# Altium footprint library DSP_FPGA_Lib.PcbLib: 30 footprints (part 2 of 2)
Each footprint in its own frame and in the unit in brackets; x right, y up, seen from the top. Pads: shape width x height; smd on the part's side, far side on the other; paste and mask are expansions set on the pad; w line width, h text height; cw(c..) or ccw(c..) is an arc to the next point about the centre after c.
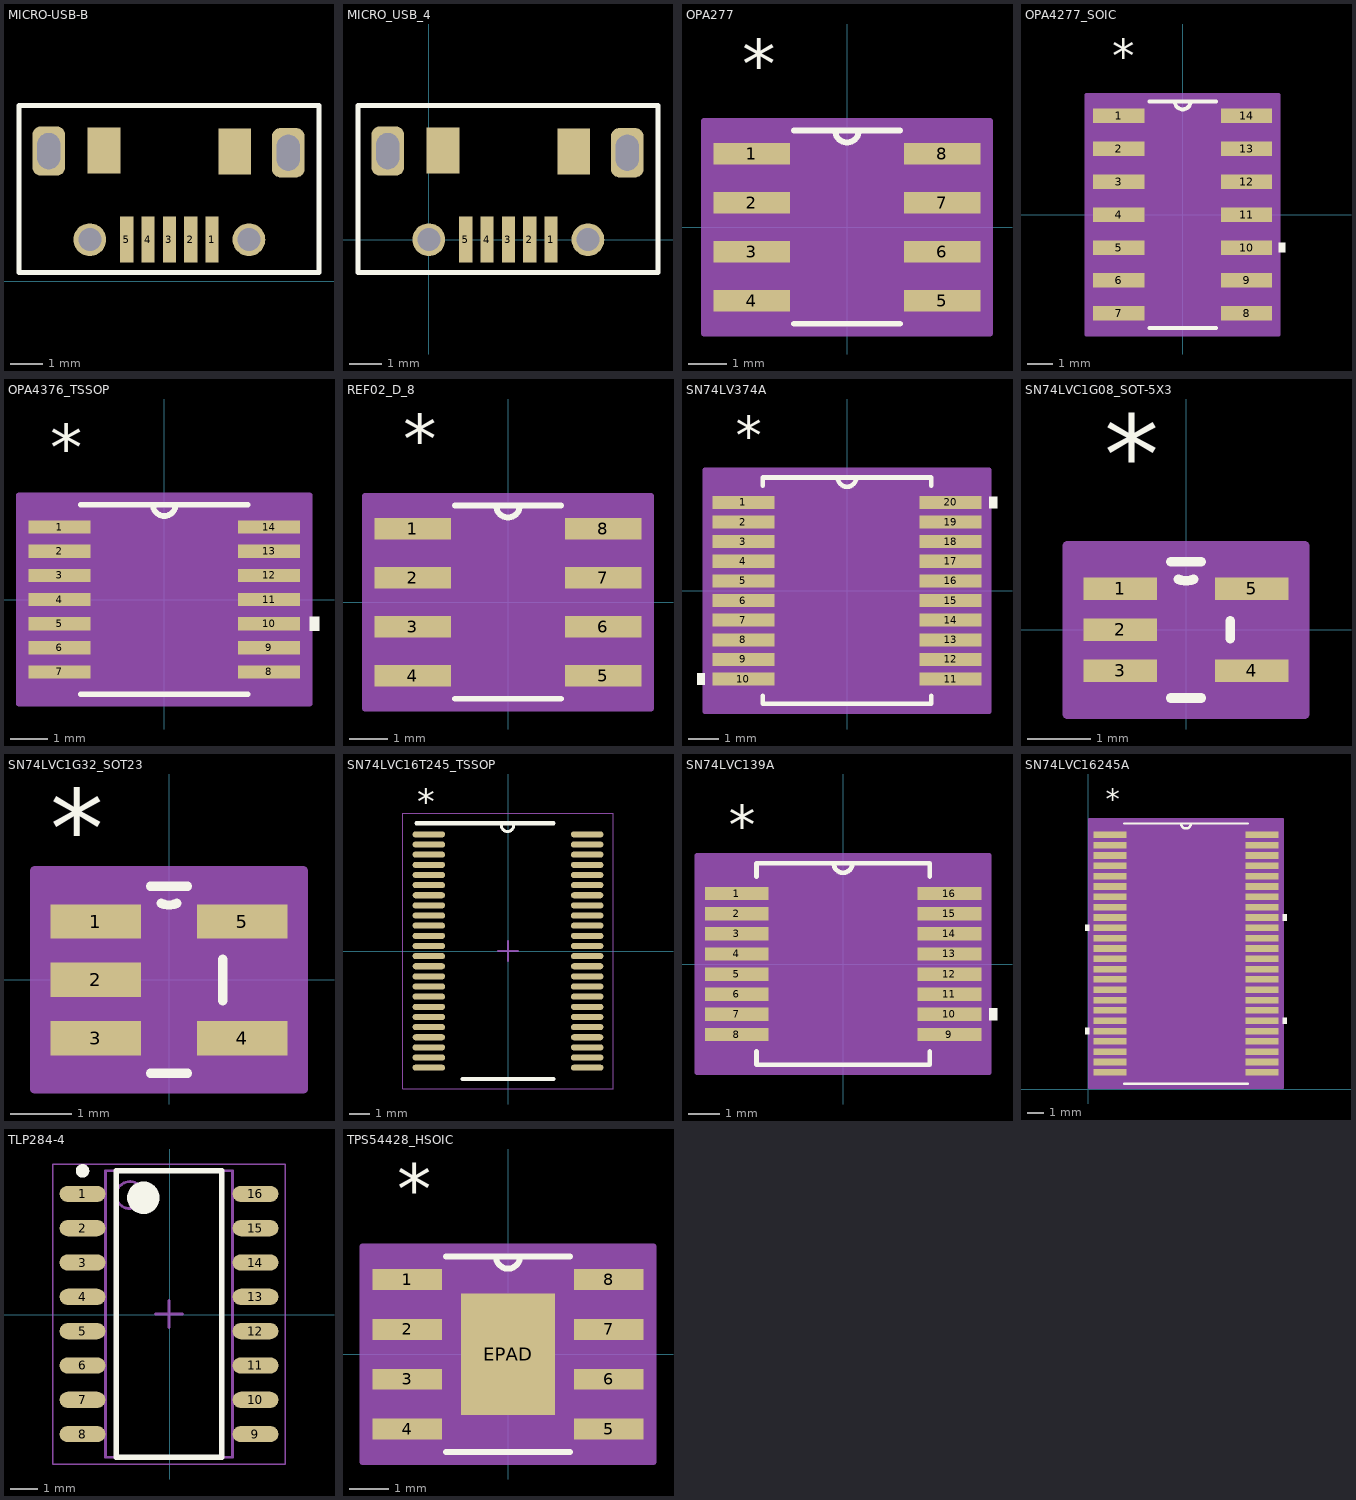
[diagram p1: the footprints below, top view; thin cyan lines are the x and y axes]

## MICRO-USB-B [mm] "MICRO-USB-B"
pads (11):
  rect 0.4x1.4 smd: 1(6.519,1.27) 2(5.869,1.27) 3(5.219,1.27) 4(4.569,1.27) 5(3.919,1.27)
  rrect50% 1x1.5 hole 0.7 slot 1.1 at 90 deg: ""(1.543,3.971) ""(8.844,3.92)
  round 1 hole 0.7: ""(2.794,1.27) ""(7.644,1.27)
  rect 1x1.4 smd: ""(3.226,3.988) ""(7.214,3.962)
Top Overlay:
  lines w0.152: 0.635,0.27 0.635,5.359 9.779,5.359 9.779,0.27 0.635,0.27
3D body "User Library-MicroUSB-B_Molex_105017-0001.SLDPRT": height 2.73, standoff -0.58, extent 1.107,1.123 9.307,6.553

## MICRO_USB_4 [mm]
pads (11):
  rect 0.4x1.4 smd: 1(3.725,0) 2(3.075,0) 3(2.425,0) 4(1.775,0) 5(1.125,0)
  rrect50% 1x1.5 hole 0.7 slot 1.1 at 90 deg: ""(-1.251,2.701) ""(6.05,2.65)
  round 1 hole 0.7: ""(0,0) ""(4.85,0)
  rect 1x1.4 smd: ""(0.432,2.718) ""(4.42,2.692)
Top Overlay:
  lines w0.152: -2.159,-1 6.985,-1 6.985,4.089 -2.159,4.089 -2.159,-1
3D body "User Library-MicroUSB-B_Molex_105017-0001.SLDPRT": height 2.73, standoff -0.58, extent -1.687,-0.147 6.513,5.283

## OPA277 [mil]
pads (8):
  rect 78x22 smd: 1(-97,75) 2(-97,25) 3(-97,-25) 4(-97,-75) 5(97,-75) 6(97,-25) 7(97,25) 8(97,75)
Top Overlay:
  lines w6: -54.08,-98.5 54.08,-98.5 ; -54.08,98.5 54.08,98.5 ; -12,98.5 ccw(c0,98.5) 12,98.5
  text "*" at -107,142 h50
Mechanical 13:
  lines w0: -12,98.5 ccw(c0,98.5) 12,98.5
  text "*" at -107,142 h50
Mechanical 15:
  region: 146,-108.5 -146,-108.5 -146,108.5 146,108.5
  lines w6: -146,-108.5 146,-108.5 146,108.5 -146,108.5 -146,-108.5
3D body "D8.stp": height 69.1, standoff 0, extent -122,-98.5 122,98.5

## OPA4277_SOIC [mil]
pads (14):
  rect 78x22 smd: 1(-97,150) 2(-97,100) 3(-97,50) 4(-97,0) 5(-97,-50) 6(-97,-100) 7(-97,-150) 8(97,-150) 9(97,-100) 10(97,-50) 11(97,0) 12(97,50) 13(97,100) 14(97,150)
Top Overlay:
  region: 146,-42.5 156,-42.5 156,-57.5 146,-57.5
  lines w6: -50.89,-172 50.89,-172 ; -50.89,172 50.89,172 ; -12,172 ccw(c0,172) 12,172
  text "*" at -107,217 h50
Mechanical 13:
  lines w0: -12,172 ccw(c0,172) 12,172
  text "*" at -107,217 h50
Mechanical 15:
  region: 146,-182 -146,-182 -146,182 146,182
  lines w6: -146,-182 146,-182 146,182 -146,182 -146,-182
3D body "D14.stp": height 69.1, standoff 0, extent -122,-172 122,172

## OPA4376_TSSOP [mil]
pads (14):
  rect 66x14 smd: 1(-111,76.77) 2(-111,51.18) 3(-111,25.59) 4(-111,0) 5(-111,-25.59) 6(-111,-51.18) 7(-111,-76.77) 8(111,-76.77) 9(111,-51.18) 10(111,-25.59) 11(111,0) 12(111,25.59) 13(111,51.18) 14(111,76.77)
Top Overlay:
  region: 154,-18.09 164,-18.09 164,-33.09 154,-33.09
  lines w6: -88.5,-100.5 88.5,-100.5 ; -88.5,100.5 88.5,100.5 ; -12,100.5 ccw(c0,100.5) 12,100.5
  text "*" at -121,135.77 h50
Mechanical 13:
  lines w0: -12,100.5 ccw(c0,100.5) 12,100.5
  text "*" at -121,135.77 h50
Mechanical 15:
  region: 154,-110.5 -154,-110.5 -154,110.5 154,110.5
  lines w6: -154,-110.5 154,-110.5 154,110.5 -154,110.5 -154,-110.5
3D body "PW14.stp": height 47.1, standoff 0, extent -130,-100.5 130,100.5

## REF02_D_8 [mil]
pads (8):
  rect 78x22 smd: 1(-97,75) 2(-97,25) 3(-97,-25) 4(-97,-75) 5(97,-75) 6(97,-25) 7(97,25) 8(97,75)
Top Overlay:
  lines w6: -54.08,-98.5 54.08,-98.5 ; -54.08,98.5 54.08,98.5 ; -12,98.5 ccw(c0,98.5) 12,98.5
  text "*" at -107,142 h50
Mechanical 13:
  lines w0: -12,98.5 ccw(c0,98.5) 12,98.5
  text "*" at -107,142 h50
Mechanical 15:
  region: 146,-108.5 -146,-108.5 -146,108.5 146,108.5
  lines w6: -146,-108.5 -146,108.5 146,108.5 146,-108.5 -146,-108.5
3D body "D8.stp": height 69.1, standoff 0, extent -122,-98.5 122,98.5

## SN74LV374A [mil]
pads (20):
  rect 81x17 smd: 1(-135,115.16) 2(-135,89.57) 3(-135,63.98) 4(-135,38.39) 5(-135,12.8) 6(-135,-12.8) 7(-135,-38.39) 8(-135,-63.98) 9(-135,-89.57) 10(-135,-115.16) 11(135,-115.16) 12(135,-89.57) 13(135,-63.98) 14(135,-38.39) 15(135,-12.8) 16(135,12.8) 17(135,38.39) 18(135,63.98) 19(135,89.57) 20(135,115.16)
Top Overlay:
  region: -185.5,-107.66 -195.5,-107.66 -195.5,-122.66 -185.5,-122.66
  region: 185.5,122.66 195.5,122.66 195.5,107.66 185.5,107.66
  lines w6: -110,-136.76 -110,-147.5 110,-147.5 110,-136.76 ; -110,136.76 -110,147.5 110,147.5 110,136.76 ; -12,147.5 ccw(c0,147.5) 12,147.5
  text "*" at -145,177.16 h50
Mechanical 13:
  lines w0: -12,147.5 ccw(c0,147.5) 12,147.5
  text "*" at -145,177.16 h50
Mechanical 15:
  region: 185.5,-157.5 -185.5,-157.5 -185.5,157.5 185.5,157.5
  lines w6: -185.5,-157.5 -185.5,157.5 185.5,157.5 185.5,-157.5 -185.5,-157.5
3D body "DB20.stp": height 79.1, standoff 0, extent -161.5,-147.5 161.5,147.5

## SN74LVC1G08_SOT-5X3 [mil]
pads (5):
  rect 46x14 smd: 1(-41,25.59) 2(-41,0) 3(-41,-25.59) 4(41,-25.59) 5(41,25.59)
Top Overlay:
  lines w6: -9.43,-42.5 9.43,-42.5 ; -9.43,42.5 9.43,42.5 ; -4.9,31.55 ccw(c0,42.5) 4.9,31.55 ; 27.5,-5.49 27.5,5.49
  text "*" at -51,84.59 h50
Mechanical 13:
  lines w0: -12,42.5 ccw(c0,42.5) 12,42.5
  text "*" at -51,84.59 h50
Mechanical 15:
  region: 74,-52.5 -74,-52.5 -74,52.5 74,52.5
  lines w6: -74,-52.5 -74,52.5 74,52.5 74,-52.5 -74,-52.5
3D body "DCK5.stp": height 43.1, standoff 0, extent -47,-42.5 47,42.5

## SN74LVC1G32_SOT23 [mil]
pads (5):
  rect 58x22 smd: 1(-47,37.4) 2(-47,0) 3(-47,-37.4) 4(47,-37.4) 5(47,37.4)
Top Overlay:
  lines w6: -11.91,-60 11.91,-60 ; -11.91,60 11.91,60 ; -4.92,49.05 ccw(c0,60) 4.92,49.05 ; 34.5,-13.3 34.5,13.3
  text "*" at -76,72.4 h50
Mechanical 13:
  lines w0: -12,60 ccw(c0,60) 12,60
  text "*" at -76,72.4 h50
Mechanical 15:
  region: 86,-70 -86,-70 -86,70 86,70
  lines w6: -86,-70 -86,70 86,70 86,-70 -86,-70
3D body "DBV5.stp": height 57.1, standoff 0, extent -59,-60 59,60

## SN74LVC16T245_TSSOP [mm]
pads (48):
  oval 1.6x0.3 smd paste+0 mask+0.051: 1(-3.9,5.75) 2(-3.9,5.25) 3(-3.9,4.75) 4(-3.9,4.25) 5(-3.9,3.75) 6(-3.9,3.25) 7(-3.9,2.75) 8(-3.9,2.25) 9(-3.9,1.75) 10(-3.9,1.25) 11(-3.9,0.75) 12(-3.9,0.25) 13(-3.9,-0.25) 14(-3.9,-0.75) 15(-3.9,-1.25) 16(-3.9,-1.75) 17(-3.9,-2.25) 18(-3.9,-2.75) 19(-3.9,-3.25) 20(-3.9,-3.75) 21(-3.9,-4.25) 22(-3.9,-4.75) 23(-3.9,-5.25) 24(-3.9,-5.75) 25(3.9,-5.75) 26(3.9,-5.25) 27(3.9,-4.75) 28(3.9,-4.25) 29(3.9,-3.75) 30(3.9,-3.25) 31(3.9,-2.75) 32(3.9,-2.25) 33(3.9,-1.75) 34(3.9,-1.25) 35(3.9,-0.75) 36(3.9,-0.25) 37(3.9,0.25) 38(3.9,0.75) 39(3.9,1.25) 40(3.9,1.75) 41(3.9,2.25) 42(3.9,2.75) 43(3.9,3.25) 44(3.9,3.75) 45(3.9,4.25) 46(3.9,4.75) 47(3.9,5.25) 48(3.9,5.75)
Top Overlay:
  lines w0.152: -0.33,6.198 ccw(c-0.025,6.198) 0.279,6.198
  lines w0.2: -4.5,6.3 2.25,6.3 ; -2.25,-6.3 2.25,-6.3
  text "*" at -4.464,6.718 h1.27
Mechanical 13:
  lines w0: -0.33,6.198 ccw(c-0.025,6.198) 0.279,6.198
  text "*" at -4.464,6.718 h1.27
Mechanical 15:
  lines w0.05: -5.2,-6.8 5.2,-6.8 5.2,6.8 -5.2,6.8 -5.2,-6.8
  lines w0.1: -0.5,0 0.5,0 ; 0,-0.5 0,0.5
3D body "DGG0048A.stp": height 1.1, standoff 0, extent -4.086,-6.252 4.035,6.248

## SN74LVC139A [mil]
pads (16):
  rect 81x17 smd: 1(-135,89.57) 2(-135,63.98) 3(-135,38.39) 4(-135,12.8) 5(-135,-12.8) 6(-135,-38.39) 7(-135,-63.98) 8(-135,-89.57) 9(135,-89.57) 10(135,-63.98) 11(135,-38.39) 12(135,-12.8) 13(135,12.8) 14(135,38.39) 15(135,63.98) 16(135,89.57)
Top Overlay:
  region: 185.5,-56.48 195.5,-56.48 195.5,-71.48 185.5,-71.48
  lines w6: -110,-111.17 -110,-128 110,-128 110,-111.17 ; -110,111.17 -110,128 110,128 110,111.17 ; -12,128 ccw(c0,128) 12,128
  text "*" at -145,151.57 h50
Mechanical 13:
  lines w0: -12,128 ccw(c0,128) 12,128
  text "*" at -145,151.57 h50
Mechanical 15:
  region: 185.5,-138 -185.5,-138 -185.5,138 185.5,138
  lines w6: -185.5,-138 185.5,-138 185.5,138 -185.5,138 -185.5,-138
3D body "DB16.stp": height 79.1, standoff 0, extent -161.5,-128 161.5,128

## SN74LVC16245A [mil]
pads (48):
  rect 80.5x16 smd: 1(53.25,615.5) 2(53.25,590.5) 3(53.25,565.5) 4(53.25,540.5) 5(53.25,515.5) 6(53.25,490.5) 7(53.25,465.5) 8(53.25,440.5) 9(53.25,415.5) 10(53.25,390.5) 11(53.25,365.5) 12(53.25,340.5) 13(53.25,315.5) 14(53.25,290.5) 15(53.25,265.5) 16(53.25,240.5) 17(53.25,215.5) 18(53.25,190.5) 19(53.25,165.5) 20(53.25,140.5) 21(53.25,115.5) 22(53.25,90.5) 23(53.25,65.5) 24(53.25,40.5) 25(420.75,40.5) 26(420.75,65.5) 27(420.75,90.5) 28(420.75,115.5) 29(420.75,140.5) 30(420.75,165.5) 31(420.75,190.5) 32(420.75,215.5) 33(420.75,240.5) 34(420.75,265.5) 35(420.75,290.5) 36(420.75,315.5) 37(420.75,340.5) 38(420.75,365.5) 39(420.75,390.5) 40(420.75,415.5) 41(420.75,440.5) 42(420.75,465.5) 43(420.75,490.5) 44(420.75,515.5) 45(420.75,540.5) 46(420.75,565.5) 47(420.75,590.5) 48(420.75,615.5)
Top Overlay:
  region: 471,423 481,423 481,408 471,408
  region: 471,173 481,173 481,158 471,158
  region: 3,148 -7,148 -7,133 3,133
  region: 3,398 -7,398 -7,383 3,383
  lines w6: 87.5,13 386.5,13 ; 87.5,643 386.5,643 ; 225,643 ccw(c237,643) 249,643
  text "*" at 43.25,676.5 h50
Mechanical 13:
  lines w0: 225,643 ccw(c237,643) 249,643
  text "*" at 43.25,676.5 h50
Mechanical 15:
  region: 471,3 3,3 3,653 471,653
  lines w6: 3,3 471,3 471,653 3,653 3,3
3D body "DL48.stp": height 110.1, standoff 0, extent 27,13 447,643

## TLP284-4 [mm]
pads (16):
  oval 1.7x0.6 smd: 1(-3.225,4.47) 2(-3.225,3.2) 3(-3.225,1.93) 4(-3.225,0.66) 5(-3.225,-0.61) 6(-3.225,-1.88) 7(-3.225,-3.15) 8(-3.225,-4.42) 9(3.175,-4.42) 10(3.175,-3.15) 11(3.175,-1.88) 12(3.175,-0.61) 13(3.175,0.66) 14(3.175,1.93) 15(3.175,3.2) 16(3.175,4.47)
Top Overlay:
  circle w0.25: c-3.225,5.32 r0.125
  circle w0.6: c-0.975,4.325 r0.3
  lines w0.2: -1.975,-5.275 -1.975,5.325 1.925,5.325 1.925,-5.275 -1.975,-5.275
Mechanical 13:
  circle w0.1: c-1.475,4.425 r0.5
  lines w0.1: -2.375,-5.275 -2.375,5.325 2.325,5.325 2.325,-5.275 -2.375,-5.275
Mechanical 15:
  lines w0.05: -4.325,-5.525 -4.325,5.575 4.275,5.575 4.275,-5.525 -4.325,-5.525
  lines w0.1: -0.525,0.025 0.475,0.025 ; -0.025,-0.475 -0.025,0.525
3D body: height 2.1, standoff 0, extent -2.375,-5.275 2.325,5.325

## TPS54428_HSOIC [mil]
pads (9):
  rect 70x21 smd: 1(-101,75) 2(-101,25) 3(-101,-25) 4(-101,-75) 5(101,-75) 6(101,-25) 7(101,25) 8(101,75)
  rect 94.49x122.05 smd paste-60.52: EPAD(0,0)
Top Overlay:
  lines w6: -62.08,-98 62.08,-98 ; -62.08,98 62.08,98 ; -12,98 ccw(c0,98) 12,98
  text "*" at -111,141 h50
Top Paste:
  region: 43.31,57.09 -43.31,57.09 -43.31,3.94 43.31,3.94
  region: 43.31,-3.94 -43.31,-3.94 -43.31,-57.09 43.31,-57.09
Mechanical 13:
  lines w0: -12,98 ccw(c0,98) 12,98
  text "*" at -111,141 h50
Mechanical 15:
  region: 146,-108 -146,-108 -146,108 146,108
  lines w6: -146,-108 -146,108 146,108 146,-108 -146,-108
3D body "DDA8_3P1X2P4.stp": height 66.1, standoff -2, extent -122,-98 122,98